# Altium footprint library SEMICONDUCTORS.PcbLib: 91 footprints (part 5 of 6)
Each footprint in its own frame and in the unit in brackets; x right, y up, seen from the top. Pads: shape width x height; smd on the part's side, far side on the other; paste and mask are expansions set on the pad; w line width, h text height; cw(c..) or ccw(c..) is an arc to the next point about the centre after c.
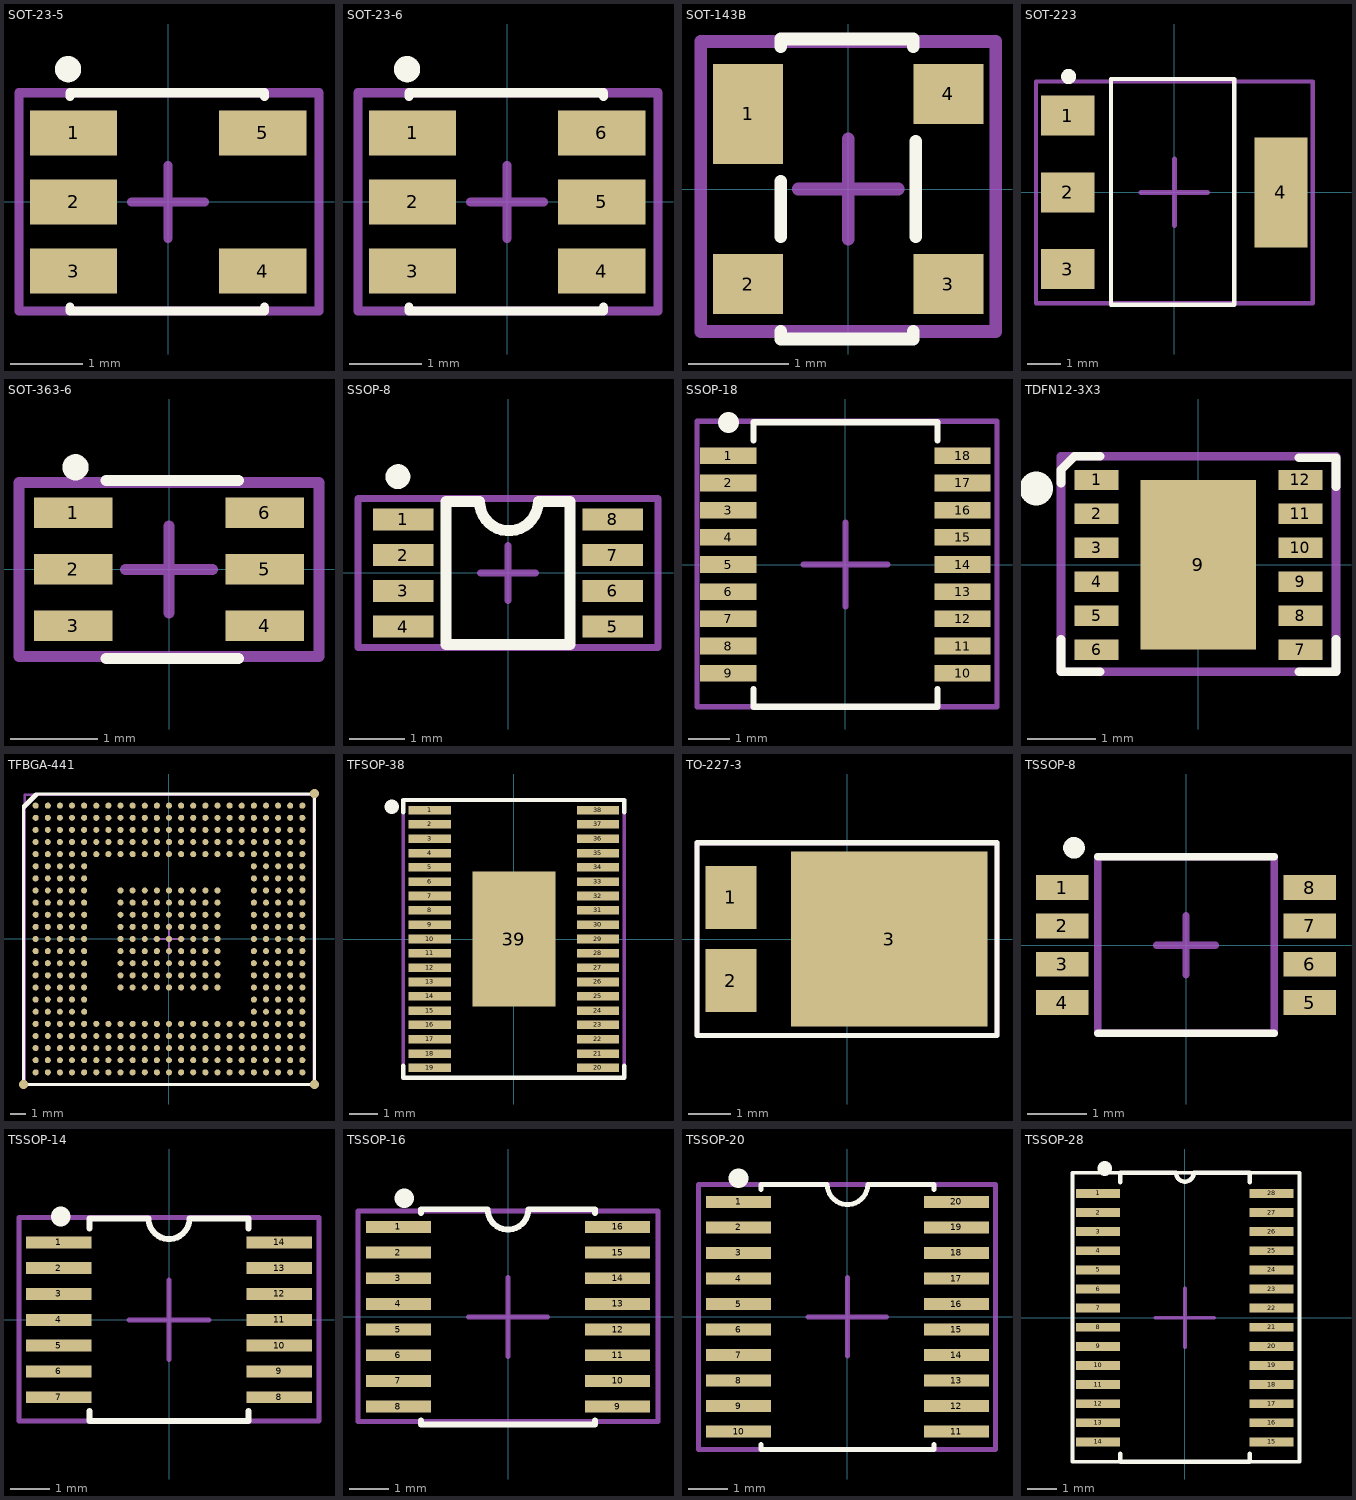
[diagram p4: the footprints below, top view; thin cyan lines are the x and y axes]

## SOT-23-5 [mm]
pads (5):
  rect 1.2x0.62 smd: 1(-1.3,0.95) 2(-1.3,0) 3(-1.3,-0.95) 4(1.3,-0.95) 5(1.3,0.95)
Top Overlay:
  circle w0.2: c-1.375,1.825 r0.08
  lines w0.127: -1.35,-1.45 -1.35,-1.5 1.325,-1.5 1.325,-1.45 ; -1.35,1.45 -1.35,1.5 1.325,1.5 1.325,1.45
Top Assembly:
  lines w0.127: -2.05,-1.5 -1.725,-1.5 2.075,-1.5 2.075,-0.65 2.075,1.5 -2.05,1.5 -2.05,-1.5
  text ".Designator" at -1.45,-0.45 h1
Top Component Center:
  lines w0.127: -0.5,0 0.5,0 ; 0,-0.5 0,0.5
3D body "SOT-23-5.step": height 1.07, standoff -0.03, extent -1.25,-1.5 1.25,1.5

## SOT-23-6 [mm]
pads (6):
  rect 1.2x0.62 smd: 1(-1.3,0.95) 2(-1.3,0) 3(-1.3,-0.95) 4(1.3,-0.95) 5(1.3,0) 6(1.3,0.95)
Top Overlay:
  circle w0.2: c-1.375,1.825 r0.08
  lines w0.127: -1.35,-1.45 -1.35,-1.5 1.325,-1.5 1.325,-1.45 ; -1.35,1.45 -1.35,1.5 1.325,1.5 1.325,1.45
Top Assembly:
  lines w0.127: -2.05,-1.5 -2.05,1.5 2.075,1.5 2.075,-0.65 2.075,-1.5 -1.725,-1.5 -2.05,-1.5
  text ".Designator" at -1.45,-0.45 h1
Top Component Center:
  lines w0.127: -0.5,0 0.5,0 ; 0,-0.5 0,0.5
3D body "SOT-23-6.step": height 1.45, standoff 0, extent -1.4,-1.45 1.4,1.45

## SOT-143B [mm]
pads (4):
  rect 0.7x1 smd: 1(-1,0.75)
  rect 0.7x0.6 smd: 2(-1,-0.95) 3(1,-0.95) 4(1,0.95)
Top Overlay:
  lines w0.127: -0.675,-1.425 -0.675,-1.5 0.65,-1.5 0.65,-1.425 ; -0.675,-0.475 -0.675,0.075 ; -0.675,1.425 -0.675,1.5 0.65,1.5 0.65,1.425 ; 0.675,-0.475 0.675,0.475
Top Assembly:
  lines w0.127: -1.475,-1.425 1.475,-1.425 1.475,1.475 -1.475,1.475 -1.475,-1.425
  text ".Designator" at -0.975,-0.375 h0.8
Top Component Center:
  lines w0.127: -0.5,0 0.5,0 ; 0,-0.5 0,0.5
3D body "SOT-143.step": height 1, standoff 0, extent -1.21,-1.46 1.21,1.46

## SOT-223 [mm]
pads (4):
  rect 1.6x1.2 smd: 1(-3.2,2.3) 2(-3.2,0) 3(-3.2,-2.3)
  rect 1.6x3.3 smd: 4(3.2,0)
Top Overlay:
  circle w0.25: c-3.175,3.475 r0.1
  lines w0.127: -1.9,-3.375 -1.9,3.4 1.8,3.4 1.8,-3.375 -1.9,-3.375
Top Assembly:
  lines w0.127: -4.15,-3.325 4.15,-3.325 4.15,3.325 -4.15,3.325 -4.15,-3.325
  text ".Designator" at -2.625,-0.675 h1.5
Top Component Center:
  lines w0.15: -1,0 1,0 ; 0,-1 0,1
3D body "SOT-223.step": height 1.69, standoff 0.04, extent -3.5,-3.25 3.5,3.25

## SOT-363-6 [mm]
pads (6):
  rect 0.9x0.35 smd: 1(-1.1,0.65) 2(-1.1,0) 3(-1.1,-0.65) 4(1.1,-0.65) 5(1.1,0) 6(1.1,0.65)
Top Overlay:
  circle w0.2: c-1.075,1.175 r0.05
  lines w0.127: -0.725,-1.025 0.8,-1.025 ; -0.725,1.025 0.8,1.025
Top Assembly:
  lines w0.127: -1.725,-1 1.725,-1 1.725,1 -1.725,1 -1.725,-1
  text ".Designator" at -1.4,-0.5 h1
Top Component Center:
  lines w0.127: -0.5,0 0.5,0 ; 0,-0.5 0,0.5
3D body "SOT-363-6.STEP": height 1.1, standoff 0, extent -1.05,-1 1.05,1

## SSOP-8 [mm]
pads (8):
  rect 1.1x0.4 smd: 1(-1.9,0.975) 2(-1.9,0.325) 3(-1.9,-0.325) 4(-1.9,-0.975) 5(1.9,-0.975) 6(1.9,-0.325) 7(1.9,0.325) 8(1.9,0.975)
Top Overlay:
  circle w0.25: c-2,1.75 r0.1
  lines w0.2: -0.525,1.3 -1.125,1.3 -1.125,-1.3 1.125,-1.3 1.125,1.3 0.55,1.3 cw(c0.017,1.3) -0.517,1.3
Top Assembly:
  lines w0.127: -2.725,-1.35 -2.725,1.35 2.725,1.35 2.725,-1.35 -2.725,-1.35
  text ".Designator" at 0.3,-1.125 h0.8
Top Component Center:
  lines w0.127: -0.5,0 0.5,0 ; 0,-0.5 0,0.5
3D body "SN74LVC2G132DCTR.step": height 1.3, standoff 0, extent -2,-1.475 2,1.475

## SSOP-18 [mm]
pads (18):
  rect 1.35x0.4 smd: 1(-2.8,2.6) 2(-2.8,1.95) 3(-2.8,1.3) 4(-2.8,0.65) 5(-2.8,0) 6(-2.8,-0.65) 7(-2.8,-1.3) 8(-2.8,-1.95) 9(-2.8,-2.6) 10(2.8,-2.6) 11(2.8,-1.95) 12(2.8,-1.3) 13(2.8,-0.65) 14(2.8,0) 15(2.8,0.65) 16(2.8,1.3) 17(2.8,1.95) 18(2.8,2.6)
Top Overlay:
  lines w0.15: -2.2,-2.975 -2.2,-3.4 2.2,-3.4 2.2,-2.975 ; -2.2,2.975 -2.2,3.4 2.2,3.4 2.2,2.975
  lines w0.5: -2.8,3.4 -2.8,3.4
Top Assembly:
  lines w0.127: -3.55,-3.4 -3.55,2.9 -3.55,3.425 3.625,3.425 3.625,-3.4 -3.55,-3.4
  text ".Designator" at 0.425,-1.925 h1.2
Top Component Center:
  lines w0.15: -1,0 1,0 ; 0,-1 0,1
3D body "SSOP-18.step": height 1.2, standoff -0.09, extent -3.209,-3.4 3.209,3.4

## TDFN12-3X3 [mm]
pads (13):
  rect 0.65x0.3 smd: 1(-1.5,1.25) 2(-1.5,0.75) 3(-1.5,0.25) 4(-1.5,-0.25) 5(-1.5,-0.75) 6(-1.5,-1.25) 7(1.5,-1.25) 8(1.5,-0.75) 9(1.5,-0.25) 10(1.5,0.25) 11(1.5,0.75) 12(1.5,1.25)
  rect 1.7x2.5 smd paste-0.254: 9(0,0)
Top Overlay:
  lines w0.127: -2.025,-1.1 -2.025,-1.575 -1.45,-1.575 ; -2.025,1.2 -2.025,1.4 -1.825,1.6 -1.45,1.6 ; 1.475,-1.575 2.025,-1.575 2.025,-1.1 ; 1.475,1.575 2.025,1.575 2.025,1.15
  lines w0.5: -2.392,1.123 -2.392,1.123
Top Assembly:
  lines w0.127: -2.025,-1.575 2.025,-1.575 2.025,1.6 -2.025,1.6 -2.025,-1.575
  text ".Designator" at 0.15,-1.2 h0.8
Top Component Center:
  lines w0.127: -0.5,0 0.5,0 ; 0,-0.5 0,0.5
3D body: height 0.25, standoff 0, extent 3.375,1.35 3.375,1.35
3D body: height 0.25, standoff 0, extent 3.575,0.9 3.575,0.9
3D body: height 0.75, standoff 0, extent -1.5,-1.506 1.5,1.506

## TFBGA-441 [mm]
pads (444):
  round 0.4 smd: A1(-8.8,8.8) A2(-8,8.8) A3(-7.2,8.8) A4(-6.4,8.8) A5(-5.6,8.8) A6(-4.8,8.8) A7(-4,8.8) A8(-3.2,8.8) A9(-2.4,8.8) A10(-1.6,8.8) A11(-0.8,8.8) A12(0,8.8) A13(0.8,8.8) A14(1.6,8.8) A15(2.4,8.8) A16(3.2,8.8) A17(4,8.8) A18(4.8,8.8) A19(5.6,8.8) A20(6.4,8.8) A21(7.2,8.8) A22(8,8.8) A23(8.8,8.8) AA1(-8.8,-7.2) AA2(-8,-7.2) AA3(-7.2,-7.2) AA4(-6.4,-7.2) AA5(-5.6,-7.2) AA6(-4.8,-7.2) AA7(-4,-7.2) AA8(-3.2,-7.2) AA9(-2.4,-7.2) AA10(-1.6,-7.2) AA11(-0.8,-7.2) AA12(0,-7.2) AA13(0.8,-7.2) AA14(1.6,-7.2) AA15(2.4,-7.2) AA16(3.2,-7.2) AA17(4,-7.2) AA18(4.8,-7.2) AA19(5.6,-7.2) AA20(6.4,-7.2) AA21(7.2,-7.2) AA22(8,-7.2) AA23(8.8,-7.2) AB1(-8.8,-8) AB2(-8,-8) AB3(-7.2,-8) AB4(-6.4,-8) AB5(-5.6,-8) AB6(-4.8,-8) AB7(-4,-8) AB8(-3.2,-8) AB9(-2.4,-8) AB10(-1.6,-8) AB11(-0.8,-8) AB12(0,-8) AB13(0.8,-8) AB14(1.6,-8) AB15(2.4,-8) AB16(3.2,-8) AB17(4,-8) AB18(4.8,-8) AB19(5.6,-8) AB20(6.4,-8) AB21(7.2,-8) AB22(8,-8) AB23(8.8,-8) AC1(-8.8,-8.8) AC2(-8,-8.8) AC3(-7.2,-8.8) AC4(-6.4,-8.8) AC5(-5.6,-8.8) AC6(-4.8,-8.8) AC7(-4,-8.8) AC8(-3.2,-8.8) AC9(-2.4,-8.8) AC10(-1.6,-8.8) AC11(-0.8,-8.8) AC12(0,-8.8) AC13(0.8,-8.8) AC14(1.6,-8.8) AC15(2.4,-8.8) AC16(3.2,-8.8) AC17(4,-8.8) AC18(4.8,-8.8) AC19(5.6,-8.8) AC20(6.4,-8.8) AC21(7.2,-8.8) AC22(8,-8.8) AC23(8.8,-8.8) B1(-8.8,8) B2(-8,8) B3(-7.2,8) B4(-6.4,8) B5(-5.6,8) B6(-4.8,8) B7(-4,8) B8(-3.2,8) B9(-2.4,8) B10(-1.6,8) B11(-0.8,8) B12(0,8) B13(0.8,8) B14(1.6,8) B15(2.4,8) B16(3.2,8) B17(4,8) B18(4.8,8) B19(5.6,8) B20(6.4,8) B21(7.2,8) B22(8,8) B23(8.8,8) C1(-8.8,7.2) C2(-8,7.2) C3(-7.2,7.2) C4(-6.4,7.2) C5(-5.6,7.2) C6(-4.8,7.2) C7(-4,7.2) C8(-3.2,7.2) C9(-2.4,7.2) C10(-1.6,7.2) C11(-0.8,7.2) C12(0,7.2) C13(0.8,7.2) C14(1.6,7.2) C15(2.4,7.2) C16(3.2,7.2) C17(4,7.2) C18(4.8,7.2) C19(5.6,7.2) C20(6.4,7.2) C21(7.2,7.2) C22(8,7.2) C23(8.8,7.2) D1(-8.8,6.4) D2(-8,6.4) D3(-7.2,6.4) D4(-6.4,6.4) D5(-5.6,6.4) D6(-4.8,6.4) D7(-4,6.4) D8(-3.2,6.4) D9(-2.4,6.4) D10(-1.6,6.4) D11(-0.8,6.4) D12(0,6.4) D13(0.8,6.4) D14(1.6,6.4) D15(2.4,6.4) D16(3.2,6.4) D17(4,6.4) D18(4.8,6.4) D19(5.6,6.4) D20(6.4,6.4) D21(7.2,6.4) D22(8,6.4) D23(8.8,6.4) E1(-8.8,5.6) E2(-8,5.6) E3(-7.2,5.6) E4(-6.4,5.6) E5(-5.6,5.6) E6(-4.8,5.6) E7(-4,5.6) E8(-3.2,5.6) E9(-2.4,5.6) E10(-1.6,5.6) E11(-0.8,5.6) E12(0,5.6) E13(0.8,5.6) E14(1.6,5.6) E15(2.4,5.6) E16(3.2,5.6) E17(4,5.6) E18(4.8,5.6) E19(5.6,5.6) E20(6.4,5.6) E21(7.2,5.6) E22(8,5.6) E23(8.8,5.6) F1(-8.8,4.8) F2(-8,4.8) F3(-7.2,4.8) F4(-6.4,4.8) F5(-5.6,4.8) F19(5.6,4.8) F20(6.4,4.8) F21(7.2,4.8) F22(8,4.8) F23(8.8,4.8) G1(-8.8,4) G2(-8,4) G3(-7.2,4) G4(-6.4,4) G5(-5.6,4) G19(5.6,4) G20(6.4,4) G21(7.2,4) G22(8,4) G23(8.8,4) H1(-8.8,3.2) H2(-8,3.2) H3(-7.2,3.2) H4(-6.4,3.2) H5(-5.6,3.2) H8(-3.2,3.2) H9(-2.4,3.2) H10(-1.6,3.2) H11(-0.8,3.2) H12(0,3.2) H13(0.8,3.2) H14(1.6,3.2) H15(2.4,3.2) H16(3.2,3.2) H19(5.6,3.2) H20(6.4,3.2) H21(7.2,3.2) H22(8,3.2) H23(8.8,3.2) J1(-8.8,2.4) J2(-8,2.4) J3(-7.2,2.4) J4(-6.4,2.4) J5(-5.6,2.4) J8(-3.2,2.4) J9(-2.4,2.4) J10(-1.6,2.4) J11(-0.8,2.4) J12(0,2.4) J13(0.8,2.4) J14(1.6,2.4) J15(2.4,2.4) J16(3.2,2.4) J19(5.6,2.4) J20(6.4,2.4) J21(7.2,2.4) J22(8,2.4) J23(8.8,2.4) K1(-8.8,1.6) K2(-8,1.6) K3(-7.2,1.6) K4(-6.4,1.6) K5(-5.6,1.6) K8(-3.2,1.6) K9(-2.4,1.6) K10(-1.6,1.6) K11(-0.8,1.6) K12(0,1.6) K13(0.8,1.6) K14(1.6,1.6) K15(2.4,1.6) K16(3.2,1.6) K19(5.6,1.6) K20(6.4,1.6) K21(7.2,1.6) K22(8,1.6) K23(8.8,1.6) L1(-8.8,0.8) L2(-8,0.8) L3(-7.2,0.8) L4(-6.4,0.8) L5(-5.6,0.8) L8(-3.2,0.8) L9(-2.4,0.8) L10(-1.6,0.8) L11(-0.8,0.8) L12(0,0.8) L13(0.8,0.8) L14(1.6,0.8) L15(2.4,0.8) L16(3.2,0.8) L19(5.6,0.8) L20(6.4,0.8) L21(7.2,0.8) L22(8,0.8) L23(8.8,0.8) M1(-8.8,0) M2(-8,0) M3(-7.2,0) M4(-6.4,0) M5(-5.6,0) M8(-3.2,0) M9(-2.4,0) M10(-1.6,0) M11(-0.8,0) M12(0,0) M13(0.8,0) M14(1.6,0) M15(2.4,0) M16(3.2,0) M19(5.6,0) M20(6.4,0) M21(7.2,0) M22(8,0) M23(8.8,0) N1(-8.8,-0.8) N2(-8,-0.8) N3(-7.2,-0.8) N4(-6.4,-0.8) N5(-5.6,-0.8) N8(-3.2,-0.8) N9(-2.4,-0.8) N10(-1.6,-0.8) N11(-0.8,-0.8) N12(0,-0.8) N13(0.8,-0.8) N14(1.6,-0.8) N15(2.4,-0.8) N16(3.2,-0.8) N19(5.6,-0.8) N20(6.4,-0.8) N21(7.2,-0.8) N22(8,-0.8) N23(8.8,-0.8) P1(-8.8,-1.6) P2(-8,-1.6) P3(-7.2,-1.6) P4(-6.4,-1.6) P5(-5.6,-1.6) P8(-3.2,-1.6) P9(-2.4,-1.6) P10(-1.6,-1.6) P11(-0.8,-1.6) P12(0,-1.6) P13(0.8,-1.6) P14(1.6,-1.6) P15(2.4,-1.6) P16(3.2,-1.6) P19(5.6,-1.6) P20(6.4,-1.6) P21(7.2,-1.6) P22(8,-1.6) P23(8.8,-1.6) R1(-8.8,-2.4) R2(-8,-2.4) R3(-7.2,-2.4) R4(-6.4,-2.4) R5(-5.6,-2.4) R8(-3.2,-2.4) R9(-2.4,-2.4) R10(-1.6,-2.4) R11(-0.8,-2.4) R12(0,-2.4) R13(0.8,-2.4) R14(1.6,-2.4) R15(2.4,-2.4) R16(3.2,-2.4) R19(5.6,-2.4) R20(6.4,-2.4) R21(7.2,-2.4) R22(8,-2.4) R23(8.8,-2.4) T1(-8.8,-3.2) T2(-8,-3.2) T3(-7.2,-3.2) T4(-6.4,-3.2) T5(-5.6,-3.2) T8(-3.2,-3.2) T9(-2.4,-3.2) T10(-1.6,-3.2) T11(-0.8,-3.2) T12(0,-3.2) T13(0.8,-3.2) T14(1.6,-3.2) T15(2.4,-3.2) T16(3.2,-3.2) T19(5.6,-3.2) T20(6.4,-3.2) T21(7.2,-3.2) T22(8,-3.2) T23(8.8,-3.2) U1(-8.8,-4) U2(-8,-4) U3(-7.2,-4) U4(-6.4,-4) U5(-5.6,-4) U19(5.6,-4) U20(6.4,-4) U21(7.2,-4) U22(8,-4) U23(8.8,-4) V1(-8.8,-4.8) V2(-8,-4.8) V3(-7.2,-4.8) V4(-6.4,-4.8) V5(-5.6,-4.8) V19(5.6,-4.8) V20(6.4,-4.8) V21(7.2,-4.8) V22(8,-4.8) V23(8.8,-4.8) W1(-8.8,-5.6) W2(-8,-5.6) W3(-7.2,-5.6) W4(-6.4,-5.6) W5(-5.6,-5.6) W6(-4.8,-5.6) W7(-4,-5.6) W8(-3.2,-5.6) W9(-2.4,-5.6) W10(-1.6,-5.6) W11(-0.8,-5.6) W12(0,-5.6) W13(0.8,-5.6) W14(1.6,-5.6) W15(2.4,-5.6) W16(3.2,-5.6) W17(4,-5.6) W18(4.8,-5.6) W19(5.6,-5.6) W20(6.4,-5.6) W21(7.2,-5.6) W22(8,-5.6) W23(8.8,-5.6) Y1(-8.8,-6.4) Y2(-8,-6.4) Y3(-7.2,-6.4) Y4(-6.4,-6.4) Y5(-5.6,-6.4) Y6(-4.8,-6.4) Y7(-4,-6.4) Y8(-3.2,-6.4) Y9(-2.4,-6.4) Y10(-1.6,-6.4) Y11(-0.8,-6.4) Y12(0,-6.4) Y13(0.8,-6.4) Y14(1.6,-6.4) Y15(2.4,-6.4) Y16(3.2,-6.4) Y17(4,-6.4) Y18(4.8,-6.4) Y19(5.6,-6.4) Y20(6.4,-6.4) Y21(7.2,-6.4) Y22(8,-6.4) Y23(8.8,-6.4)
  round 0.6 smd paste-0.381: FID1(9.6,9.6) FID2(9.6,-9.6) FID3(-9.6,-9.6)
Top Overlay:
  lines w0.203: -9.6,8.6 -9.6,8.8 -8.825,9.575 -8.625,9.575 ; -9.6,8.6 -9.6,-9 -9.6,-9.6 -9,-9.6 9,-9.6 9.6,-9.6 9.6,-9 9.6,9.575 -8.625,9.575 ; -9.6,8.6 -8.625,9.575
Top Assembly:
  lines w0.15: -9.525,-9.575 -9.525,9.525 9.55,9.525 9.55,-9.575 -9.525,-9.575
  text ".Designator" at -2.7,-0.4 h1.5
Top Component Center:
  lines w0.127: -1,0 1,0 ; 0,-1 0,1
3D body: height 1.41, standoff 1, extent -8.698,8.101 -8.1,8.7
3D body: height 0.37, standoff -0.03, extent 8.601,7.803 9,8.197
3D body: height 0.37, standoff -0.03, extent 7.801,7.803 8.2,8.197
3D body: height 0.37, standoff -0.03, extent 7.001,7.803 7.4,8.197
3D body: height 0.37, standoff -0.03, extent 8.61,8.603 9.009,8.997
3D body: height 0.37, standoff -0.03, extent 7.81,8.603 8.21,8.997
3D body: height 0.37, standoff -0.03, extent 7.01,8.603 7.409,8.997
3D body: height 0.37, standoff -0.03, extent 5.401,-8.997 5.8,-8.603
3D body: height 0.37, standoff -0.03, extent 4.597,-8.997 4.996,-8.603
3D body: height 0.37, standoff -0.03, extent 3.796,-8.996 4.196,-8.602
3D body: height 0.37, standoff -0.03, extent 2.992,-8.997 3.391,-8.603
3D body: height 0.37, standoff -0.03, extent 5.401,-8.196 5.8,-7.802
3D body: height 0.37, standoff -0.03, extent 4.597,-8.196 4.996,-7.802
3D body: height 0.37, standoff -0.03, extent 3.796,-8.195 4.196,-7.801
3D body: height 0.37, standoff -0.03, extent 2.992,-8.196 3.391,-7.802
3D body: height 0.37, standoff -0.03, extent 5.405,-7.397 5.804,-7.003
3D body: height 0.37, standoff -0.03, extent 4.601,-7.397 5,-7.003
3D body: height 0.37, standoff -0.03, extent 3.8,-7.396 4.2,-7.002
3D body: height 0.37, standoff -0.03, extent 2.996,-7.397 3.396,-7.003
3D body: height 0.37, standoff -0.03, extent 2.998,-5.797 3.397,-5.403
3D body: height 0.37, standoff -0.03, extent 3.001,-6.597 3.4,-6.203
3D body: height 0.37, standoff -0.03, extent 3.802,-5.796 4.201,-5.402
3D body: height 0.37, standoff -0.03, extent 3.805,-6.596 4.204,-6.202
3D body: height 0.37, standoff -0.03, extent 4.603,-5.797 5.002,-5.403
3D body: height 0.37, standoff -0.03, extent 4.606,-6.597 5.005,-6.203
3D body: height 0.37, standoff -0.03, extent 6.201,-8.996 6.6,-8.602
3D body: height 0.37, standoff -0.03, extent 6.201,-8.196 6.601,-7.802
3D body: height 0.37, standoff -0.03, extent 6.201,-7.396 6.6,-7.002
3D body: height 0.37, standoff -0.03, extent 7.001,-8.996 7.4,-8.602
3D body: height 0.37, standoff -0.03, extent 7.001,-8.196 7.401,-7.802
3D body: height 0.37, standoff -0.03, extent 7.001,-7.396 7.4,-7.002
3D body: height 0.37, standoff -0.03, extent 7.811,-8.997 8.211,-8.603
3D body: height 0.37, standoff -0.03, extent 7.812,-8.197 8.211,-7.803
3D body: height 0.37, standoff -0.03, extent 7.811,-7.397 8.211,-7.003
3D body: height 0.37, standoff -0.03, extent 8.605,-8.996 9.004,-8.602
3D body: height 0.37, standoff -0.03, extent 8.606,-8.196 9.005,-7.802
3D body: height 0.37, standoff -0.03, extent 8.605,-7.396 9.004,-7.002
3D body: height 0.37, standoff -0.03, extent 8.601,5.404 9,5.798
3D body: height 0.37, standoff -0.03, extent 8.601,6.204 9.001,6.598
3D body: height 0.37, standoff -0.03, extent 8.601,7.004 9,7.398
3D body: height 0.37, standoff -0.03, extent 7.81,5.404 8.21,5.797
3D body: height 0.37, standoff -0.03, extent 7.811,6.204 8.21,6.597
3D body: height 0.37, standoff -0.03, extent 7.81,7.004 8.21,7.398
3D body: height 0.37, standoff -0.03, extent 7.001,5.403 7.4,5.797
3D body: height 0.37, standoff -0.03, extent 7.001,6.203 7.401,6.597
3D body: height 0.37, standoff -0.03, extent 7.001,7.003 7.4,7.397
3D body: height 0.37, standoff -0.03, extent -5.797,7.003 -5.398,7.397
3D body: height 0.37, standoff -0.03, extent -5.797,7.803 -5.397,8.197
3D body: height 0.37, standoff -0.03, extent -5.797,8.603 -5.398,8.997
3D body: height 0.37, standoff -0.03, extent 0.603,-0.997 1.002,-0.603
3D body: height 0.37, standoff -0.03, extent 0.603,-1.797 1.003,-1.403
3D body: height 0.37, standoff -0.03, extent 0.603,-2.597 1.002,-2.203
3D body: height 0.37, standoff -0.03, extent 0.604,-3.397 1.003,-3.003
3D body: height 0.37, standoff -0.03, extent 1.403,-0.997 1.802,-0.603
3D body: height 0.37, standoff -0.03, extent 1.403,-1.797 1.803,-1.403
3D body: height 0.37, standoff -0.03, extent 1.403,-2.597 1.802,-2.203
3D body: height 0.37, standoff -0.03, extent 1.404,-3.397 1.803,-3.003
3D body: height 0.37, standoff -0.03, extent 2.203,-0.997 2.602,-0.603
3D body: height 0.37, standoff -0.03, extent 2.203,-1.797 2.603,-1.403
3D body: height 0.37, standoff -0.03, extent 2.203,-2.597 2.602,-2.203
3D body: height 0.37, standoff -0.03, extent 2.204,-3.397 2.603,-3.003
3D body: height 0.37, standoff -0.03, extent 3.003,-0.997 3.402,-0.603
3D body: height 0.37, standoff -0.03, extent 3.003,-1.797 3.403,-1.403
3D body: height 0.37, standoff -0.03, extent 3.003,-2.597 3.402,-2.203
3D body: height 0.37, standoff -0.03, extent 3.004,-3.397 3.403,-3.003
3D body: height 0.37, standoff -0.03, extent 0.614,-0.197 1.014,0.197
3D body: height 0.37, standoff -0.03, extent 0.61,3.003 1.009,3.397
3D body: height 0.37, standoff -0.03, extent 0.611,2.203 1.01,2.597
3D body: height 0.37, standoff -0.03, extent 0.61,1.403 1.009,1.797
3D body: height 0.37, standoff -0.03, extent 0.611,0.603 1.011,0.997
3D body: height 0.37, standoff -0.03, extent 1.414,-0.197 1.814,0.197
3D body: height 0.37, standoff -0.03, extent 1.41,3.003 1.809,3.397
3D body: height 0.37, standoff -0.03, extent 1.411,2.203 1.81,2.597
3D body: height 0.37, standoff -0.03, extent 1.41,1.403 1.81,1.797
3D body: height 0.37, standoff -0.03, extent 1.411,0.603 1.811,0.997
3D body: height 0.37, standoff -0.03, extent 2.214,-0.197 2.614,0.197
3D body: height 0.37, standoff -0.03, extent 2.21,3.003 2.609,3.397
3D body: height 0.37, standoff -0.03, extent 2.211,2.203 2.61,2.597
3D body: height 0.37, standoff -0.03, extent 2.21,1.403 2.609,1.797
3D body: height 0.37, standoff -0.03, extent 2.211,0.603 2.611,0.997
3D body: height 0.37, standoff -0.03, extent 3.014,-0.197 3.414,0.197
3D body: height 0.37, standoff -0.03, extent 3.01,3.003 3.409,3.397
3D body: height 0.37, standoff -0.03, extent 3.011,2.203 3.41,2.597
3D body: height 0.37, standoff -0.03, extent 3.01,1.403 3.41,1.797
3D body: height 0.37, standoff -0.03, extent 3.011,0.603 3.411,0.997
3D body: height 0.37, standoff -0.03, extent -3.403,-0.996 -3.004,-0.603
3D body: height 0.37, standoff -0.03, extent -3.403,-1.797 -3.003,-1.403
3D body: height 0.37, standoff -0.03, extent -3.403,-2.596 -3.004,-2.203
3D body: height 0.37, standoff -0.03, extent -3.402,-3.397 -3.003,-3.003
3D body: height 0.37, standoff -0.03, extent -2.603,-0.996 -2.204,-0.603
3D body: height 0.37, standoff -0.03, extent -2.603,-1.797 -2.203,-1.403
3D body: height 0.37, standoff -0.03, extent -2.603,-2.596 -2.204,-2.203
3D body: height 0.37, standoff -0.03, extent -2.602,-3.397 -2.203,-3.003
3D body: height 0.37, standoff -0.03, extent -1.803,-0.996 -1.404,-0.603
3D body: height 0.37, standoff -0.03, extent -1.803,-1.797 -1.403,-1.403
3D body: height 0.37, standoff -0.03, extent -1.803,-2.596 -1.404,-2.203
3D body: height 0.37, standoff -0.03, extent -1.802,-3.397 -1.403,-3.003
3D body: height 0.37, standoff -0.03, extent -1.003,-0.996 -0.604,-0.603
3D body: height 0.37, standoff -0.03, extent -1.003,-1.797 -0.603,-1.403
3D body: height 0.37, standoff -0.03, extent -1.003,-2.596 -0.604,-2.203
3D body: height 0.37, standoff -0.03, extent -1.002,-3.397 -0.603,-3.003
3D body: height 0.37, standoff -0.03, extent -0.203,-0.996 0.196,-0.603
3D body: height 0.37, standoff -0.03, extent -0.203,-1.797 0.197,-1.403
3D body: height 0.37, standoff -0.03, extent -0.203,-2.596 0.196,-2.203
3D body: height 0.37, standoff -0.03, extent -0.202,-3.397 0.197,-3.003
3D body: height 0.37, standoff -0.03, extent -3.395,-0.196 -2.996,0.198
3D body: height 0.37, standoff -0.03, extent -3.399,3.004 -3,3.397
3D body: height 0.37, standoff -0.03, extent -3.398,2.204 -2.999,2.597
3D body: height 0.37, standoff -0.03, extent -3.399,1.404 -3,1.797
3D body: height 0.37, standoff -0.03, extent -3.398,0.604 -2.999,0.997
3D body: height 0.37, standoff -0.03, extent -2.595,-0.196 -2.196,0.198
3D body: height 0.37, standoff -0.03, extent -2.599,3.004 -2.2,3.397
3D body: height 0.37, standoff -0.03, extent -2.598,2.204 -2.199,2.597
3D body: height 0.37, standoff -0.03, extent -2.599,1.404 -2.2,1.797
3D body: height 0.37, standoff -0.03, extent -2.598,0.604 -2.199,0.997
3D body: height 0.37, standoff -0.03, extent -1.795,-0.196 -1.396,0.198
3D body: height 0.37, standoff -0.03, extent -1.799,3.004 -1.4,3.397
3D body: height 0.37, standoff -0.03, extent -1.798,2.204 -1.399,2.597
3D body: height 0.37, standoff -0.03, extent -1.799,1.404 -1.4,1.797
3D body: height 0.37, standoff -0.03, extent -1.798,0.604 -1.399,0.997
3D body: height 0.37, standoff -0.03, extent -0.995,-0.196 -0.596,0.198
3D body: height 0.37, standoff -0.03, extent -0.999,3.004 -0.6,3.397
3D body: height 0.37, standoff -0.03, extent -0.998,2.204 -0.599,2.597
3D body: height 0.37, standoff -0.03, extent -0.999,1.404 -0.6,1.797
3D body: height 0.37, standoff -0.03, extent -0.998,0.604 -0.599,0.997
3D body: height 0.37, standoff -0.03, extent -0.195,-0.196 0.204,0.198
3D body: height 0.37, standoff -0.03, extent -0.199,3.004 0.2,3.397
3D body: height 0.37, standoff -0.03, extent -0.198,2.204 0.201,2.597
3D body: height 0.37, standoff -0.03, extent -0.199,1.404 0.2,1.797
3D body: height 0.37, standoff -0.03, extent -0.198,0.604 0.201,0.997
3D body: height 0.37, standoff -0.03, extent -0.99,-8.996 -0.591,-8.602
3D body: height 0.37, standoff -0.03, extent -0.994,-5.796 -0.595,-5.402
3D body: height 0.37, standoff -0.03, extent -0.994,-6.596 -0.595,-6.202
3D body: height 0.37, standoff -0.03, extent -0.994,-7.396 -0.595,-7.002
3D body: height 0.37, standoff -0.03, extent -0.993,-8.196 -0.594,-7.802
3D body: height 0.37, standoff -0.03, extent -0.19,-8.996 0.209,-8.602
3D body: height 0.37, standoff -0.03, extent -0.194,-5.796 0.205,-5.402
3D body: height 0.37, standoff -0.03, extent -0.194,-6.596 0.205,-6.202
3D body: height 0.37, standoff -0.03, extent -0.194,-7.396 0.205,-7.002
3D body: height 0.37, standoff -0.03, extent -0.193,-8.196 0.206,-7.802
3D body: height 0.37, standoff -0.03, extent 0.61,-8.996 1.009,-8.602
3D body: height 0.37, standoff -0.03, extent 0.606,-5.796 1.005,-5.402
3D body: height 0.37, standoff -0.03, extent 0.606,-6.596 1.005,-6.202
3D body: height 0.37, standoff -0.03, extent 0.606,-7.396 1.005,-7.002
3D body: height 0.37, standoff -0.03, extent 0.607,-8.196 1.006,-7.802
3D body: height 0.37, standoff -0.03, extent 1.41,-8.996 1.809,-8.602
3D body: height 0.37, standoff -0.03, extent 1.406,-5.796 1.805,-5.402
3D body: height 0.37, standoff -0.03, extent 1.406,-6.596 1.805,-6.202